# Altium footprint library Hydra_Ref_pcb.PcbLib: 353 footprints (part 19 of 23)
Each footprint in its own frame and in the unit in brackets; x right, y up, seen from the top. Pads: shape width x height; smd on the part's side, far side on the other; paste and mask are expansions set on the pad; w line width, h text height; cw(c..) or ccw(c..) is an arc to the next point about the centre after c.
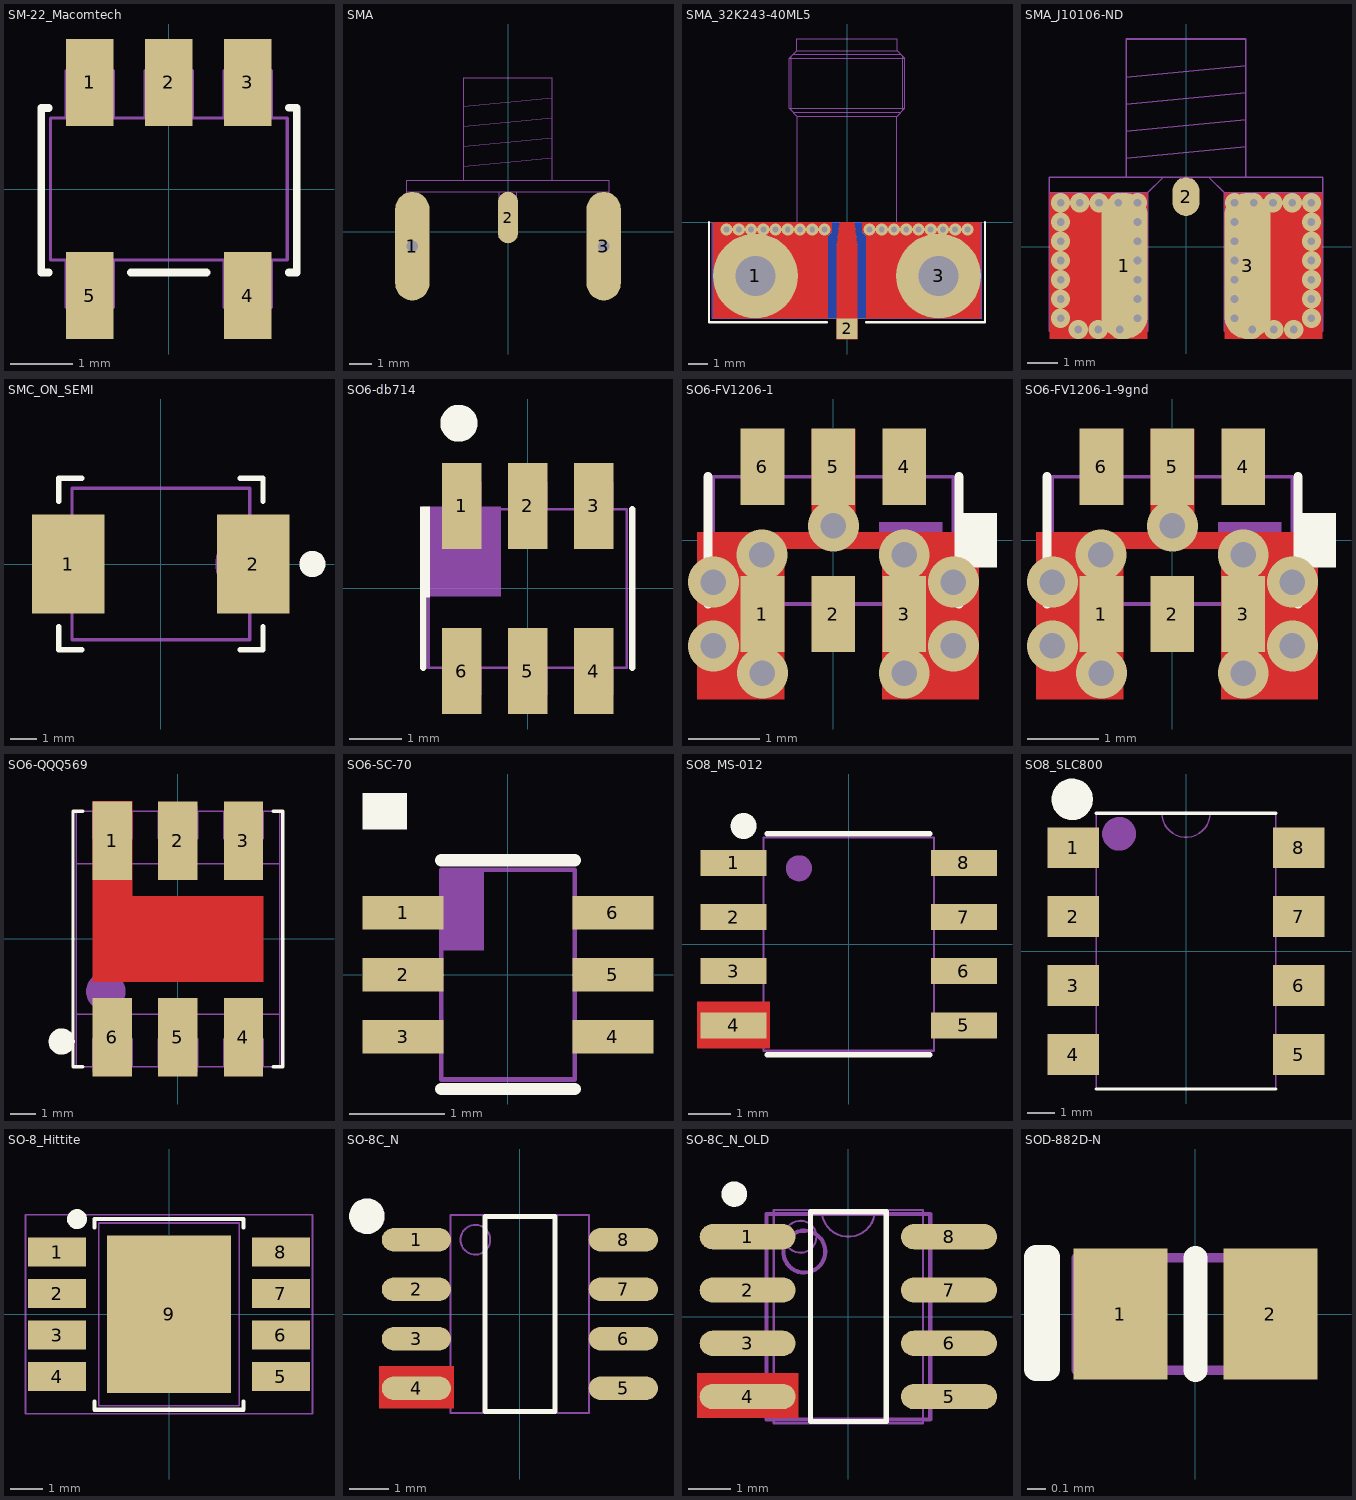
[diagram p18: the footprints below, top view; thin cyan lines are the x and y axes]

## SM-22_Macomtech [mil] "SM-22 Package; 150 X 150 MIL"
height 106.3
pads (5):
  rect 30x55 smd: 1(-50,67.5) 2(0,67.5) 3(50,67.5) 4(50,-67.5) 5(-50,-67.5)
Top Overlay:
  lines w5: -76,-52.9 -80.8,-52.9 -80.8,51.32 -76,51.32 ; -24,-52.9 24,-52.9 ; 76,-52.78 81.07,-52.78 81.07,51.44 76,51.44
9 Top Assy:
  lines w2: -65,-45 -65,-75 -35,-75 -35,-45 ; -65,45 -65,75 -35,75 -35,45 ; -15,45 -15,75 15,75 15,45 ; 35,-45 35,-75 65,-75 65,-45 ; 35,45 35,75 65,75 65,45 ; -75,-45 75,-45 75,45 -75,45 -75,-45
  text ".Designator" at -45,-10 h20
3D body: height 106.3, standoff 0.39, extent -75,-45 75,45

## SMA [mil] "old part"
pads (3):
  oval 60x190 hole 20: 1(-167.5,-25) 3(167.5,-25)
  oval 35x90 smd: 2(0,25)
9 Top Assy:
  lines w2: -157.5,70 -157.5,-110 -177.5,-110 -177.5,70 ; -77.5,90 -77.5,270 77.5,270 77.5,90 ; -77.5,115 77.5,130 ; -77.5,150 77.5,165 ; -77.5,185 77.5,200 ; -77.5,220 77.5,235 ; -15,70 -15,-10 15,-10 15,70 ; 157.5,70 157.5,-110 177.5,-110 177.5,70 ; -177.5,70 177.5,70 ; -177.5,70 -177.5,90 177.5,90 177.5,70
  text ".Designator" at -100,-105 h60

## SMA_32K243-40ML5 [mm]
height 6
pads (3):
  round 4.4 hole 2.1: 1(-4.75,-2.8) 3(4.75,-2.8)
  rect 1.067x1.067 smd: 2(0,-5.537)
via -6.248,-0.381 diameter 0.635 hole 0.305
via -5.613,-0.381 diameter 0.635 hole 0.305
via -4.978,-0.381 diameter 0.635 hole 0.305
via -4.343,-0.381 diameter 0.635 hole 0.305
via -3.708,-0.381 diameter 0.635 hole 0.305
via -3.073,-0.381 diameter 0.635 hole 0.305
via 6.248,-0.381 diameter 0.635 hole 0.305
via 5.613,-0.381 diameter 0.635 hole 0.305
via 4.978,-0.381 diameter 0.635 hole 0.305
via 4.343,-0.381 diameter 0.635 hole 0.305
via 3.708,-0.381 diameter 0.635 hole 0.305
via 3.073,-0.381 diameter 0.635 hole 0.305
via -1.168,-0.381 diameter 0.635 hole 0.305
via 1.168,-0.381 diameter 0.635 hole 0.305
via 1.803,-0.381 diameter 0.635 hole 0.305
via 2.438,-0.381 diameter 0.635 hole 0.305
via -1.803,-0.381 diameter 0.635 hole 0.305
via -2.438,-0.381 diameter 0.635 hole 0.305
Top Layer:
  region: -0.787,0 -0.787,-0.508 -1,-0.721 -1,-4.999 -6.947,-5.002 -6.947,0
  region: -0.381,0 -0.533,-1.27 -0.533,-6.071 0.533,-6.071 0.533,-1.27 0.381,0
  region: 0.787,0 0.787,-0.508 1,-0.721 1,-5 6.947,-5 6.947,0
Bottom Layer:
  rectangle: -7,-5 7,0
Top Overlay:
  lines w0.127: -7.163,0 -7.163,-5.207 -1.041,-5.207 ; 1,-5.207 7.163,-5.207 7.163,0
Top Paste:
  region: -0.381,0 -0.533,-1.27 -0.533,-6.071 0.533,-6.071 0.533,-1.27 0.381,0
Top Solder:
  region: 0.72,0.05 0.72,-0.52 0.92,-0.72 0.92,-5.11 7.05,-5.11 7.05,0.05
  region: -0.446,0.05 -0.63,-1.48 -0.63,-6.071 0.63,-6.071 0.63,-1.39 0.457,0.05
  region: -0.72,0.05 -0.72,-0.55 -0.92,-0.75 -0.92,-5.097 -7.04,-5.101 -7.04,0.05
Bottom Solder:
  rectangle: -7.04,-5.11 7.05,0.05
9 Top Assy:
  circle w0.051: c4.75,-2.8 r2
  circle w0.051: c4.75,-2.8 r1.8
  circle w0.051: c-4.75,-2.8 r2
  circle w0.051: c-4.75,-2.8 r1.8
  lines w0.051: -2.9,5.8 -2.9,8.6 ; -2.8,5.7 2.8,5.7 ; -2.8,8.7 2.8,8.7 ; -2.58,0 -2.58,5.5 ; 2.58,0 2.58,5.5 ; 2.9,5.8 2.9,8.6 ; -3,5.9 3,5.9 ; -3,5.9 -2.6,5.5 2.6,5.5 3,5.9 ; -3,5.9 -3,8.5 ; -3,8.5 3,8.5 ; -3,8.5 -2.6,8.9 ; -2.6,8.9 2.6,8.9 ; -2.6,8.9 -2.6,9.5 2.6,9.5 2.6,8.9 ; 2.6,8.9 3,8.5 ; 3,5.9 3,8.5 ; -7,-5 7,-5 7,0 -7,0 -7,-5 ; -5.55,-2.8 -5.175,-2.125 -4.325,-2.125 -3.95,-2.8 -4.325,-3.475 -5.175,-3.475 -5.55,-2.8 ; 3.95,-2.8 4.325,-2.125 5.175,-2.125 5.55,-2.8 5.175,-3.475 4.325,-3.475 3.95,-2.8
  text ".Designator" at -2.3,-3.5 h1.52

## SMA_J10106-ND [mil] "old part"
pads (3):
  oval 60x190 smd: 1(-80,-25) 3(80,-25)
  oval 35x50 smd: 2(0,65)
via 63,57 diameter 25 hole 10
via 63,32 diameter 25 hole 10
via 63,7 diameter 25 hole 10
via 63,-18 diameter 25 hole 10
via 63,-43 diameter 25 hole 10
via 63,-68 diameter 25 hole 10
via 63,-93 diameter 25 hole 10
via 88,57 diameter 25 hole 10
via 113,57 diameter 25 hole 10
via 138,57 diameter 25 hole 10
via 163,57 diameter 25 hole 10
via 163,-93 diameter 25 hole 10
via 163,-68 diameter 25 hole 10
via 163,-43 diameter 25 hole 10
via 163,-18 diameter 25 hole 10
via 163,7 diameter 25 hole 10
via 163,32 diameter 25 hole 10
via 140,-107.67 diameter 25 hole 10
via 86,-107.67 diameter 25 hole 10
via 114,-107.67 diameter 25 hole 10
via -114,-107.67 diameter 25 hole 10
via -86,-107.67 diameter 25 hole 10
via -140,-107.67 diameter 25 hole 10
via -163,32 diameter 25 hole 10
via -163,7 diameter 25 hole 10
via -163,-18 diameter 25 hole 10
via -163,-43 diameter 25 hole 10
via -163,-68 diameter 25 hole 10
via -163,-93 diameter 25 hole 10
via -163,57 diameter 25 hole 10
via -138,57 diameter 25 hole 10
via -113,57 diameter 25 hole 10
via -88,57 diameter 25 hole 10
via -63,-93 diameter 25 hole 10
via -63,-68 diameter 25 hole 10
via -63,-43 diameter 25 hole 10
via -63,-18 diameter 25 hole 10
via -63,7 diameter 25 hole 10
via -63,32 diameter 25 hole 10
via -63,57 diameter 25 hole 10
Top Layer:
  rectangle: -177.5,-120 -50,70
  region: 177.5,70 50,70 50,-120 177.5,-120
9 Top Assy:
  lines w2: -77.5,90 -77.5,270 77.5,270 77.5,90 ; -77.5,115 77.5,130 ; -77.5,150 77.5,165 ; -77.5,185 77.5,200 ; -77.5,220 77.5,235 ; -7.5,90 -7.5,45 7.5,45 7.5,90 ; -177.5,70 -50,70 ; -177.5,70 -177.5,90 177.5,90 177.5,70 ; -177.5,70 -177.5,-110 -50,-110 -50,70 ; -50,70 -30,90 30,90 50,70 ; 50,-110 50,70 ; 50,-110 177.5,-110 ; 50,-110 50,70 ; 50,-110 177.5,-110 ; 50,70 177.5,70 ; 177.5,-110 177.5,70 ; 177.5,-110 177.5,70
  text ".Designator" at 100,-105 h5
  text ".Designator" at 200,-105 h5
  text ".Designator" at -200,-105 h5
  text ".Designator" at -100,-105 h5

## SMC_ON_SEMI [mil] "SMC PLASTIC PACKAGE CASE 403-03 270X230X84(mil)"
height 84
pads (2):
  rect 110x150 smd: 1(-140.5,0) 2(140.5,0)
Top Overlay:
  circle w20: c230,0 r10
  lines w8: -155,-95 -155,-130 -120,-130 ; -155,95 -155,130 -120,130 ; 120,-130 155,-130 155,-95 ; 120,130 155,130 155,95
9 Top Assy:
  lines w5: 135,-50 cw(c135,0) 135,50 ; -135,-115 -135,115 135,115 135,-115 -135,-115
  text ".Designator" at -65,-15 h40
3D body: height 84.02, standoff 0.39, extent -135,-115 135,115

## SO6-db714 [mil] "CASE STYLDB714"
height 160
pads (6):
  rect 30x65 smd: 1(-50,62.5) 2(0,62.5) 3(50,62.5) 4(50,-62.5) 5(0,-62.5) 6(-50,-62.5)
Top Overlay:
  circle w14: c-52,125 r7
  region: -74,-7 -74,62 -81.5,62 -81.5,-7
  lines w5: -79,-60 -79,58 ; 79,-60 79,60
9 Top Assy:
  region: -20,62 -79,62 -79,-6 -20,-6
  lines w2: -64,-60 -64,-80 -36,-80 -36,-60 ; -64,60 -64,80 -36,80 -36,60 ; -14,-60 -14,-80 14,-80 14,-60 ; -14,60 -14,80 14,80 14,60 ; 36,-60 36,-80 64,-80 64,-60 ; 36,60 36,80 64,80 64,60 ; -75,-60 -75,60 75,60 75,-60 -75,-60
  text ".Designator" at -68,-53 h38
3D body: height 160, standoff 0.39, extent -75,-60 75,60

## SO6-FV1206-1 [mil] "CASE STYLE FV1206-1-Mini-Circuit"
height 50
pads (6):
  rect 24x42 smd: 1(-39,-40.5) 2(0,-40.5) 3(39,-40.5) 4(39,40.5) 5(0,40.5) 6(-39,40.5)
via 39,-73 diameter 28 hole 14
via -39,-73 diameter 28 hole 14
via 39,-8 diameter 28 hole 14
via -39.33,-8 diameter 28 hole 14
via 0,8 diameter 28 hole 14
via -66,-23 diameter 28 hole 14
via -66,-58.01 diameter 28 hole 14
via 66,-58.01 diameter 28 hole 14
via 66,-23 diameter 28 hole 14
Top Layer:
  region: 12,61 12.01,4.5 80,4.5 80,-87.5 27,-87.5 27,-4.5 -27,-4.5 -27,-87.5 -75,-87.5 -75,4.5 -12,4.5 -12,61
  lines w24: -39,-73 -39,-40.51 ; 39,-73 39,-40.51
Top Overlay:
  region: 90,15 69,15 69,-15 90,-15
  lines w5: -69,-35 -69,35 ; 69,-35 69,35
9 Top Assy:
  region: 60,-10 60,10 25,10 25,-10
  region: 60,-10 60,10 25,10 25,-10
  lines w2: -66,-35 66,-35 66,35 -66,35 -66,-35
  text ".Designator" at -60,-30 h22
3D body: height 50, standoff 0.39, extent -85,-88 85,70

## SO6-FV1206-1-9gnd [mil] "CASE STYLE FV1206-1-Mini-Circuit"
height 50
pads (6):
  rect 24x42 smd: 1(-39,-40.5) 2(0,-40.5) 3(39,-40.5) 4(39,40.5) 5(0,40.5) 6(-39,40.5)
via 66,-23 diameter 28 hole 14
via 66,-58.01 diameter 28 hole 14
via -66,-58.01 diameter 28 hole 14
via -66,-23 diameter 28 hole 14
via 0,8 diameter 28 hole 14
via -39.33,-8 diameter 28 hole 14
via 39,-8 diameter 28 hole 14
via -39,-73 diameter 28 hole 14
via 39,-73 diameter 28 hole 14
Top Layer:
  region: 12,61 12.01,4.5 80,4.5 80,-87.5 27,-87.5 27,-4.5 -27,-4.5 -27,-87.5 -75,-87.5 -75,4.5 -12,4.5 -12,61
  lines w24: -39,-73 -39,-40.51 ; 39,-73 39,-40.51
Top Overlay:
  region: 90,15 69,15 69,-15 90,-15
  lines w5: -69,-35 -69,35 ; 69,-35 69,35
9 Top Assy:
  region: 60,-10 60,10 25,10 25,-10
  region: 60,-10 60,10 25,10 25,-10
  lines w2: -66,-35 -66,35 66,35 66,-35 -66,-35
  text ".Designator" at -60,-30 h22
3D body: height 50, standoff 0.39, extent -85,-88 85,70

## SO6-QQQ569 [mil] "CASE STYLE QQQ569 -Mini-Circuit"
height 225
pads (6):
  rect 60x120 smd mask+3: 1(-100,150) 2(0,150) 3(100,150) 4(100,-150) 5(0,-150) 6(-100,-150)
Top Layer:
  region: -130,210 -70,210 -70,65 130,65 130,-65 -130,-65
Top Overlay:
  circle w20: c-177.2,-156.4 r10
  lines w5: -145,-195 -160,-195 -160,-97.5 -160,97.5 -160,195 -145,195 ; 145,-195 160,-195 160,195 145,195
9 Top Assy:
  circle w30: c-110,-80 r15
  region: -70,-202.5 -70,-195 -130,-195 -130,-202.5
  region: 30,-202.5 30,-195 -30,-195 -30,-202.5
  region: -130,202.5 -130,195 -70,195 -70,202.5
  region: -30,202.5 -30,195 30,195 30,202.5
  region: 70,202.5 70,195 130,195 130,202.5
  region: 130,-202.5 130,-195 70,-195 70,-202.5
  lines w2: -155,-115 155,-115 ; -155,115 155,115 ; -130,-195 -130,-152.5 -70,-152.5 -70,-195 ; -130,195 -130,152.5 -70,152.5 -70,195 ; -30,-195 -30,-152.5 30,-152.5 30,-195 ; -30,195 -30,152.5 30,152.5 30,195 ; 70,-195 70,-152.5 130,-152.5 130,-195 ; 70,195 70,152.5 130,152.5 130,195 ; -155,-195 -155,-97.5 -155,97.5 -155,195 155,195 155,-195 -155,-195
  text ".Designator" at -125,-5 h65
3D body: height 0.23, standoff 0, extent -180,-230 180,230

## SO6-SC-70 [mm] "PACKAGE type SC-70"
height 1.1
pads (6):
  rect 0.85x0.35 smd: 1(-1.1,0.65) 2(-1.1,0) 3(-1.1,-0.65) 4(1.1,-0.65) 5(1.1,0) 6(1.1,0.65)
Top Overlay:
  region: -1.059,1.524 -1.059,1.905 -1.524,1.905 -1.524,1.524
  lines w0.127: -0.7,-1.2 0.7,-1.2 ; -0.7,1.2 0.7,1.2
9 Top Assy:
  rectangle: -0.7,0.254 -0.254,1.1
  lines w0.051: -0.907,-0.749 -0.907,-0.546 ; -0.907,-0.102 -0.907,0.102 ; -0.907,0.546 -0.907,0.749 ; -0.729,-0.749 -1.11,-0.749 -1.11,-0.546 -0.729,-0.546 ; -0.729,-0.102 -1.11,-0.102 -1.11,0.102 -0.729,0.102 ; -0.729,0.546 -1.11,0.546 -1.11,0.749 -0.729,0.749 ; 0.729,-0.749 1.11,-0.749 1.11,-0.546 0.729,-0.546 ; 0.729,-0.102 1.11,-0.102 1.11,0.102 0.729,0.102 ; 0.729,0.546 1.11,0.546 1.11,0.749 0.729,0.749 ; 0.907,-0.749 0.907,-0.546 ; 0.907,-0.102 0.907,0.102 ; 0.907,0.546 0.907,0.749 ; -0.7,-1.1 -0.7,1.1 0.7,1.1 0.7,-1.1 -0.7,-1.1
  text ".Designator" at 0.5,-1 h0.56
3D body: height 1.1, standoff 0.01, extent -1.778,-1.4 1.778,1.4

## SO8_MS-012 [mil] "JEDEC M-012"
height 70
pads (8):
  rect 61x24 smd: 1(-106.3,75) 2(-106.3,25) 3(-106.3,-25) 4(-106.3,-75) 5(106.3,-75) 6(106.3,-25) 7(106.3,25) 8(106.3,75)
Top Layer:
  pour cut-out: -140,-96 -140,-53 -73,-53 -73,-96
Top Overlay:
  circle w12: c-97,109 r6
  lines w5: -75,-102 75,-102 ; -75,102 75,102
9 Top Assy:
  circle w12: c-46,70 r6
  lines w2: -78.74,-98.43 -78.74,98.43 78.74,98.43 78.74,-98.43 -78.74,-98.43
  text ".Designator" at 30,-85 h25
3D body: height 70, standoff 0.39, extent -78.74,-98.43 78.74,98.43

## SO8_SLC800 [mil] "SOLID STATE OPTRONICS 8 PIN SMD"
height 155
pads (8):
  rect 75x59 smd: 1(-163.5,150) 2(-163.5,50) 3(-163.5,-50) 4(-163.5,-150) 5(163.5,-150) 6(163.5,-50) 7(163.5,50) 8(163.5,150)
Top Overlay:
  circle w30: c-165,220 r15
  lines w5: -130,-200 130,-200 ; -130,200 130,200
9 Top Assy:
  circle w25: c-97,170 r12
  lines w2: -35,200 ccw(c0,200) 35,200 ; -130,-200 -130,200 130,200 130,-200 -130,-200
  text ".Designator" at 15,-180 h60
3D body: height 155, standoff 0.39, extent -230,-230 230,230

## SO-8_Hittite [mm] "Hittite C8, 8 LEAD CERAMIC/METAL, Body 5.59x4.32mm, Pitch 1.27mm, Thermal Pad 4.83.2x3.81.2mm"
height 2.41
pads (9):
  rect 1.78x0.89 smd: 1(-3.43,1.905) 2(-3.43,0.635) 3(-3.43,-0.635) 4(-3.43,-1.905) 5(3.43,-1.905) 6(3.43,-0.635) 7(3.43,0.635) 8(3.43,1.905)
  rect 3.81x4.83 smd: 9(0,0)
Top Overlay:
  circle w0.305: c-2.819,2.921 r0.152
  lines w0.127: -2.286,-2.667 -2.286,-2.921 2.286,-2.921 2.286,-2.667 ; -2.286,2.667 -2.286,2.921 2.286,2.921 2.286,2.667
Top Solder:
  pour cut-out: -4.597,2.692 4.597,2.692 4.597,-2.692 -4.597,-2.692
9 Top Assy:
  circle w0.1: c-1.275,1.924 r0.377
  lines w0.051: -2.15,-2.8 -2.15,2.8 2.15,2.8 2.15,-2.8 ; -2.15,-2.8 2.15,-2.8 ; -2.15,-2.8 2.15,-2.8
  text ".Designator" at 0.381,-2.413 h0.64
15 Top Optical Placement:
  lines w0.051: -4.4,-3.05 -4.4,3.05 4.4,3.05 4.4,-3.05 -4.4,-3.05
  lines w0.1: -0.5,0 0.5,0 ; 0,-0.5 0,0.5
3D body: height 2.41, standoff 0.1, extent -2.15,-2.8 2.15,2.8

## SO-8C_N [mil] "old part"
height 70
pads (8):
  oval 70x23.62 smd: 1(-104.49,75) 2(-104.49,25) 3(-104.49,-25) 4(-104.49,-75) 5(104.49,-75) 6(104.49,-25) 7(104.49,25) 8(104.49,75)
Top Layer:
  pour cut-out: -142,-95 -142,-53 -67,-53 -67,-95
Top Overlay:
  circle w18: c-154.54,98.75 r9
  lines w5: -35.43,-98.43 35.43,-98.43 35.43,98.43 -35.43,98.43 -35.43,-98.43
9 Top Assy:
  circle w2: c-45,75 r15
  lines w2: -70,-100 -70,100 70,100 70,-100 -70,-100
  text ".Designator" at -5.51,70.2 h40
3D body: height 70, standoff 0, extent -150,-110 150,110

## SO-8C_N_OLD [mm] "old part"
height 1.778
pads (8):
  oval 2.286x0.6 smd: 1(-2.4,1.905) 2(-2.4,0.635) 3(-2.4,-0.635) 4(-2.4,-1.905) 5(2.4,-1.905) 6(2.4,-0.635) 7(2.4,0.635) 8(2.4,1.905)
Top Layer:
  pour cut-out: -3.607,-2.413 -3.607,-1.346 -1.194,-1.346 -1.194,-2.413
Top Overlay:
  circle w0.305: c-2.718,2.921 r0.152
  lines w0.127: -0.9,-2.5 0.9,-2.5 0.9,2.5 -0.9,2.5 -0.9,-2.5
9 Top Assy:
  circle w0.051: c-1.143,1.905 r0.381
  lines w0.051: -1.778,-2.54 -1.778,2.54 -0.635,2.54 ccw(c0,2.54) 0.635,2.54 1.778,2.54 1.778,-2.54 -1.778,-2.54
  text ".Designator" at 0.381,-2.032 h1.02
13 Top 3D Bodies:
  circle w0.1: c-1.05,1.55 r0.5
  lines w0.1: -1.95,-2.45 1.95,-2.45 1.95,2.45 -1.95,2.45 -1.95,-2.45
3D body: height 1.78, standoff 0, extent -3.81,-2.794 3.81,2.794

## SOD-882D-N [mm] "8mm Pitch, 1.05L,0.65W,0.4H (mm)"
height 0.4
pads (2):
  rect 0.5x0.7 smd mask+0.05: 1(-0.4,0) 2(0.4,0)
Top Overlay:
  lines w0.127: 0,-0.3 0,0.3 ; -0.851,-0.295 -0.851,0.305 -0.787,0.305 -0.787,-0.295 -0.851,-0.295
9 Top Assy:
  lines w0.051: -0.584,-0.295 -0.584,0.3 ; -0.55,-0.3 -0.55,0.3 ; -0.508,-0.3 -0.508,0.295 ; -0.635,-0.3 0.55,-0.3 0.55,0.3 -0.635,0.3 -0.635,-0.3
  text ".Designator" at -0.432,-0.152 h0.25
3D body: height 0.4, standoff 0.01, extent -0.813,-0.508 0.813,0.492